# Altium footprint library HSD_connectors.PcbLib: 59 footprints (part 3 of 7) (continued)
## ROS-D4S20L-40MA5-A_V [mm] "HSD Right Angle Plug, Edge Mount Pin in Paste, 27.3x12x6.95mm, Rosenberger Recommended" (continued)
  region: -3.75,1.307 -3.645,1.307 -3.436,1.336 -3.233,1.395 -3.041,1.481 -2.863,1.593 -2.702,1.729 -2.561,1.886 -2.444,2.061 -2.398,2.156 -2.4,2.156 -2.4,5.907 -2.478,5.915 -2.622,5.974 -2.733,6.085 -2.792,6.229 -2.8,6.307 -3.75,6.307 -3.75,3.307 -3.639,3.3 -3.425,3.242 -3.233,3.131 -3.076,2.974 -2.965,2.782 -2.907,2.568 -2.907,2.346 -2.965,2.132 -3.076,1.94 -3.233,1.783 -3.425,1.672 -3.639,1.614 -3.75,1.607
  region: -5.1,6.307 -3.75,6.307 -3.75,3.307 -3.861,3.3 -4.075,3.242 -4.267,3.131 -4.424,2.974 -4.535,2.782 -4.593,2.568 -4.593,2.346 -4.535,2.132 -4.424,1.94 -4.267,1.783 -4.075,1.672 -3.861,1.614 -3.75,1.607 -3.75,1.307 -3.855,1.307 -4.064,1.336 -4.267,1.395 -4.459,1.481 -4.637,1.593 -4.798,1.729 -4.939,1.886 -5.056,2.061 -5.102,2.156 -5.1,2.156
  region: -3.75,11.307 -3.645,11.307 -3.436,11.278 -3.233,11.219 -3.041,11.133 -2.863,11.021 -2.702,10.885 -2.561,10.728 -2.444,10.553 -2.398,10.458 -2.4,10.458 -2.4,6.707 -2.478,6.699 -2.622,6.64 -2.733,6.529 -2.792,6.385 -2.8,6.307 -3.75,6.307 -3.75,9.307 -3.639,9.314 -3.425,9.372 -3.233,9.483 -3.076,9.64 -2.965,9.832 -2.907,10.046 -2.907,10.268 -2.965,10.482 -3.076,10.674 -3.233,10.831 -3.425,10.942 -3.639,11 -3.75,11.007
  region: -5.1,6.307 -3.75,6.307 -3.75,9.307 -3.861,9.314 -4.075,9.372 -4.267,9.483 -4.424,9.64 -4.535,9.832 -4.593,10.046 -4.593,10.268 -4.535,10.482 -4.424,10.674 -4.267,10.831 -4.075,10.942 -3.861,11 -3.75,11.007 -3.75,11.307 -3.855,11.307 -4.064,11.278 -4.267,11.219 -4.459,11.133 -4.637,11.021 -4.798,10.885 -4.939,10.728 -5.056,10.553 -5.102,10.458 -5.1,10.458
  region: 3.75,11.307 3.645,11.307 3.436,11.278 3.233,11.219 3.041,11.133 2.863,11.021 2.702,10.885 2.561,10.728 2.444,10.553 2.398,10.458 2.4,10.458 2.4,6.707 2.478,6.699 2.622,6.64 2.733,6.529 2.792,6.385 2.8,6.307 3.75,6.307 3.75,9.307 3.639,9.314 3.425,9.372 3.233,9.483 3.076,9.64 2.965,9.832 2.907,10.046 2.907,10.268 2.965,10.482 3.076,10.674 3.233,10.831 3.425,10.942 3.639,11 3.75,11.007
  region: 5.1,6.307 3.75,6.307 3.75,9.307 3.861,9.314 4.075,9.372 4.267,9.483 4.424,9.64 4.535,9.832 4.593,10.046 4.593,10.268 4.535,10.482 4.424,10.674 4.267,10.831 4.075,10.942 3.861,11 3.75,11.007 3.75,11.307 3.855,11.307 4.064,11.278 4.267,11.219 4.459,11.133 4.637,11.021 4.798,10.885 4.939,10.728 5.056,10.553 5.102,10.458 5.1,10.458
Top Overlay:
  lines w0.2: -4.5,1.054 -4.5,-0.191 ; -2.903,11.509 2.903,11.509 ; 4.5,1.054 4.5,-0.191 3.725,-0.191 -3.725,-0.191 -4.5,-0.191 ; -4.5,-0.191 -4.5,-0.191
Top Paste:
  drawing of 8 lines, arcs and shapes, not listed
Top Solder:
  drawing of 8 lines, arcs and shapes, not listed
Mechanical 3:
  lines w0.1: -5.7,0 5.8,0
  text "Board Edge" at -5.4,-0.6 h0.2
Mechanical 13:
  circle w0.1: c-1,5.307 r0.34
  circle w0.1: c-1,7.307 r0.34
  circle w0.1: c1,7.307 r0.34
  circle w0.1: c1,5.307 r0.34
  circle w0.1: c3.75,10.157 r0.675
  circle w0.1: c-3.75,10.157 r0.675
  circle w0.1: c-3.75,2.457 r0.675
  circle w0.1: c3.75,2.457 r0.675
  circle w0.1: c0,1.307 r0.7
  lines w0.1: -4.493,0.748 ccw(c-3.75,2.457) -2.42,1.152 ; -4.493,4.166 cw(c-3.75,2.457) -2.42,3.762 -2.42,8.852 cw(c-3.75,10.157) -4.493,8.448 ; -3.725,-2.341 -3.725,-2.241 3.725,-2.241 3.725,-2.341 ; -3.725,-0.491 -0.785,-0.491 ; -3,-2.241 -3,-1.241 ; -2.425,1.151 ccw(c0,1.932) 2.425,1.151 ; -1.7,-7.291 1.7,-7.291 1.7,-6.441 -1.7,-6.441 -1.693,-7.291 ; -1.2,-13.791 1.2,-13.791 ; -0.915,1.194 -1.121,1.194 -1.121,1.42 -0.915,1.42 cw(c0,1.307) -0.798,1.77 ; -0.915,1.194 ccw(c0,1.307) -0.113,0.392 -0.113,0.186 0.113,0.186 0.113,0.392 ccw(c0,1.307) 0.915,1.194 ; -0.798,1.771 -1.025,1.771 -1.025,2.007 -0.6,2.007 ; -0.6,2.007 cw(c0,1.307) -0.261,2.191 ; -0.215,2.357 0.285,2.357 ; 0.25,2.191 0.25,2.357 ; 0.261,2.191 cw(c0,1.307) 0.6,2.007 ; 0.6,2.007 1.025,2.007 1.025,1.771 0.798,1.771 ; 0.785,-0.491 3.725,-0.491 ; 0.798,1.77 cw(c0,1.307) 0.915,1.42 1.121,1.42 1.121,1.194 0.915,1.194 ; 2.42,1.152 ccw(c3.75,2.457) 4.493,0.748 ; 2.898,-2.241 2.898,-1.241 ; 4.493,4.166 ccw(c3.75,2.457) 2.42,3.762 2.42,8.852 ccw(c3.75,10.157) 4.493,8.448 ; 4.747,-4.996 -4.717,-5.011 ; 5.842,-15.791 5.969,-15.791 ; 5.983,-6.518 4.742,-4.99 4.75,-2.341 -4.75,-2.341 -4.717,-5.011 ; -5.983,-6.518 6,-6.518 6,-15.791 -6,-15.791 -5.983,-6.518 ; -5.983,-6.518 -4.717,-5.011 ; -3.725,-0.191 3.725,-0.191 ; -3.725,-0.191 -3.725,-1.241 -3,-1.241 ; -3.725,-0.191 -4.5,-0.191 -4.5,11.509 4.5,11.509 4.5,-0.191 3.725,-0.191 ; -3,-1.241 2.898,-1.241 ; 0.285,2.357 -0.285,2.357 -0.285,2.732 0.285,2.732 0.285,2.357 ; 2.898,-1.241 3.725,-1.241 3.725,-0.191 ; -1.2,-14.655 -1.2,-11.341 1.2,-11.341 1.2,-14.638 -1.2,-14.655 ; -0.875,2.357 cw(c-0.5,2.357) -0.5,2.732 -0.5,2.357 -0.875,2.357 ; -0.25,2.191 -0.25,2.357 -0.25,2.191 ; 0.5,2.357 0.875,2.357 ccw(c0.5,2.357) 0.5,2.732 0.5,2.357
  text ".Designator" at -3.798,-4.402 h2.69
Mechanical 15:
  lines w0.05: -6.1,-15.891 -6.1,11.609 6.1,11.609 6.1,-15.891 -6.1,-15.891
  lines w0.1: -0.5,0 0.5,0 ; 0,-0.5 0,0.5
3D body "d4s20l-40mA5-A.stp": height 10.95, standoff -3.2, extent -6,-15.843 6,11.457

## ROS-D4S20L-40MA5-B_V [mm] "HSD Right Angle Plug, Edge Mount Pin in Paste, 27.3x12x6.95mm, Rosenberger Recommended"
height 6.95
pads (8):
  round 1.4 hole 0.9: 1(-1,7.307) 2(-1,5.307) 3(1,5.307) 4(1,7.307)
  round 2.2 hole 1.7: MH(-3.75,2.457) MH(-3.75,10.157) MH(3.75,2.457) MH(3.75,10.157)
Top Layer:
  region: 1.75,9.007 1.75,9.081 1.721,9.226 1.665,9.362 1.583,9.485 1.478,9.59 1.355,9.672 1.219,9.728 1.074,9.757 1,9.757 1,7.757 1.088,7.748 1.25,7.681 1.374,7.557 1.441,7.395 1.441,7.219 1.374,7.057 1.25,6.933 1.088,6.866 1,6.857 1,6.557 1.074,6.557 1.219,6.586 1.355,6.642 1.478,6.724 1.583,6.829 1.665,6.952 1.721,7.088 1.75,7.233 1.75,7.307
  region: 0.25,9.007 0.25,9.081 0.279,9.226 0.335,9.362 0.417,9.485 0.522,9.59 0.645,9.672 0.781,9.728 0.926,9.757 1,9.757 1,7.757 0.912,7.748 0.75,7.681 0.626,7.557 0.559,7.395 0.559,7.219 0.626,7.057 0.75,6.933 0.912,6.866 1,6.857 1,6.557 0.926,6.557 0.781,6.586 0.645,6.642 0.522,6.724 0.417,6.829 0.335,6.952 0.279,7.088 0.25,7.233 0.25,7.307
  region: 0.25,3.607 0.25,3.533 0.279,3.388 0.335,3.252 0.417,3.129 0.522,3.024 0.645,2.942 0.781,2.886 0.926,2.857 1,2.857 1,4.857 0.912,4.866 0.75,4.933 0.626,5.057 0.559,5.219 0.559,5.395 0.626,5.557 0.75,5.681 0.912,5.748 1,5.757 1,6.057 0.926,6.057 0.781,6.028 0.645,5.972 0.522,5.89 0.417,5.785 0.335,5.662 0.279,5.526 0.25,5.381 0.25,5.307
  region: 1.75,3.607 1.75,3.533 1.721,3.388 1.665,3.252 1.583,3.129 1.478,3.024 1.355,2.942 1.219,2.886 1.074,2.857 1,2.857 1,4.857 1.088,4.866 1.25,4.933 1.374,5.057 1.441,5.219 1.441,5.395 1.374,5.557 1.25,5.681 1.088,5.748 1,5.757 1,6.057 1.074,6.057 1.219,6.028 1.355,5.972 1.478,5.89 1.583,5.785 1.665,5.662 1.721,5.526 1.75,5.381 1.75,5.307
  region: -0.25,3.607 -0.25,3.533 -0.279,3.388 -0.335,3.252 -0.417,3.129 -0.522,3.024 -0.645,2.942 -0.781,2.886 -0.926,2.857 -1,2.857 -1,4.857 -0.912,4.866 -0.75,4.933 -0.626,5.057 -0.559,5.219 -0.559,5.395 -0.626,5.557 -0.75,5.681 -0.912,5.748 -1,5.757 -1,6.057 -0.926,6.057 -0.781,6.028 -0.645,5.972 -0.522,5.89 -0.417,5.785 -0.335,5.662 -0.279,5.526 -0.25,5.381 -0.25,5.307
  region: -1.75,3.607 -1.75,3.533 -1.721,3.388 -1.665,3.252 -1.583,3.129 -1.478,3.024 -1.355,2.942 -1.219,2.886 -1.074,2.857 -1,2.857 -1,4.857 -1.088,4.866 -1.25,4.933 -1.374,5.057 -1.441,5.219 -1.441,5.395 -1.374,5.557 -1.25,5.681 -1.088,5.748 -1,5.757 -1,6.057 -1.074,6.057 -1.219,6.028 -1.355,5.972 -1.478,5.89 -1.583,5.785 -1.665,5.662 -1.721,5.526 -1.75,5.381 -1.75,5.307
  region: -0.25,9.007 -0.25,9.081 -0.279,9.226 -0.335,9.362 -0.417,9.485 -0.522,9.59 -0.645,9.672 -0.781,9.728 -0.926,9.757 -1,9.757 -1,7.757 -0.912,7.748 -0.75,7.681 -0.626,7.557 -0.559,7.395 -0.559,7.219 -0.626,7.057 -0.75,6.933 -0.912,6.866 -1,6.857 -1,6.557 -0.926,6.557 -0.781,6.586 -0.645,6.642 -0.522,6.724 -0.417,6.829 -0.335,6.952 -0.279,7.088 -0.25,7.233 -0.25,7.307
  region: -1.75,9.007 -1.75,9.081 -1.721,9.226 -1.665,9.362 -1.583,9.485 -1.478,9.59 -1.355,9.672 -1.219,9.728 -1.074,9.757 -1,9.757 -1,7.757 -1.088,7.748 -1.25,7.681 -1.374,7.557 -1.441,7.395 -1.441,7.219 -1.374,7.057 -1.25,6.933 -1.088,6.866 -1,6.857 -1,6.557 -1.074,6.557 -1.219,6.586 -1.355,6.642 -1.478,6.724 -1.583,6.829 -1.665,6.952 -1.721,7.088 -1.75,7.233 -1.75,7.307
  region: 5.1,6.307 3.75,6.307 3.75,3.307 3.861,3.3 4.075,3.242 4.267,3.131 4.424,2.974 4.535,2.782 4.593,2.568 4.593,2.346 4.535,2.132 4.424,1.94 4.267,1.783 4.075,1.672 3.861,1.614 3.75,1.607 3.75,1.307 3.855,1.307 4.064,1.336 4.267,1.395 4.459,1.481 4.637,1.593 4.798,1.729 4.939,1.886 5.056,2.061 5.102,2.156 5.1,2.156
  region: 3.75,1.307 3.645,1.307 3.436,1.336 3.233,1.395 3.041,1.481 2.863,1.593 2.702,1.729 2.561,1.886 2.444,2.061 2.398,2.156 2.4,2.156 2.4,5.907 2.478,5.915 2.622,5.974 2.733,6.085 2.792,6.229 2.8,6.307 3.75,6.307 3.75,3.307 3.639,3.3 3.425,3.242 3.233,3.131 3.076,2.974 2.965,2.782 2.907,2.568 2.907,2.346 2.965,2.132 3.076,1.94 3.233,1.783 3.425,1.672 3.639,1.614 3.75,1.607
  region: -3.75,1.307 -3.645,1.307 -3.436,1.336 -3.233,1.395 -3.041,1.481 -2.863,1.593 -2.702,1.729 -2.561,1.886 -2.444,2.061 -2.398,2.156 -2.4,2.156 -2.4,5.907 -2.478,5.915 -2.622,5.974 -2.733,6.085 -2.792,6.229 -2.8,6.307 -3.75,6.307 -3.75,3.307 -3.639,3.3 -3.425,3.242 -3.233,3.131 -3.076,2.974 -2.965,2.782 -2.907,2.568 -2.907,2.346 -2.965,2.132 -3.076,1.94 -3.233,1.783 -3.425,1.672 -3.639,1.614 -3.75,1.607
  region: -5.1,6.307 -3.75,6.307 -3.75,3.307 -3.861,3.3 -4.075,3.242 -4.267,3.131 -4.424,2.974 -4.535,2.782 -4.593,2.568 -4.593,2.346 -4.535,2.132 -4.424,1.94 -4.267,1.783 -4.075,1.672 -3.861,1.614 -3.75,1.607 -3.75,1.307 -3.855,1.307 -4.064,1.336 -4.267,1.395 -4.459,1.481 -4.637,1.593 -4.798,1.729 -4.939,1.886 -5.056,2.061 -5.102,2.156 -5.1,2.156
  region: -3.75,11.307 -3.645,11.307 -3.436,11.278 -3.233,11.219 -3.041,11.133 -2.863,11.021 -2.702,10.885 -2.561,10.728 -2.444,10.553 -2.398,10.458 -2.4,10.458 -2.4,6.707 -2.478,6.699 -2.622,6.64 -2.733,6.529 -2.792,6.385 -2.8,6.307 -3.75,6.307 -3.75,9.307 -3.639,9.314 -3.425,9.372 -3.233,9.483 -3.076,9.64 -2.965,9.832 -2.907,10.046 -2.907,10.268 -2.965,10.482 -3.076,10.674 -3.233,10.831 -3.425,10.942 -3.639,11 -3.75,11.007
  region: -5.1,6.307 -3.75,6.307 -3.75,9.307 -3.861,9.314 -4.075,9.372 -4.267,9.483 -4.424,9.64 -4.535,9.832 -4.593,10.046 -4.593,10.268 -4.535,10.482 -4.424,10.674 -4.267,10.831 -4.075,10.942 -3.861,11 -3.75,11.007 -3.75,11.307 -3.855,11.307 -4.064,11.278 -4.267,11.219 -4.459,11.133 -4.637,11.021 -4.798,10.885 -4.939,10.728 -5.056,10.553 -5.102,10.458 -5.1,10.458
  region: 3.75,11.307 3.645,11.307 3.436,11.278 3.233,11.219 3.041,11.133 2.863,11.021 2.702,10.885 2.561,10.728 2.444,10.553 2.398,10.458 2.4,10.458 2.4,6.707 2.478,6.699 2.622,6.64 2.733,6.529 2.792,6.385 2.8,6.307 3.75,6.307 3.75,9.307 3.639,9.314 3.425,9.372 3.233,9.483 3.076,9.64 2.965,9.832 2.907,10.046 2.907,10.268 2.965,10.482 3.076,10.674 3.233,10.831 3.425,10.942 3.639,11 3.75,11.007
  region: 5.1,6.307 3.75,6.307 3.75,9.307 3.861,9.314 4.075,9.372 4.267,9.483 4.424,9.64 4.535,9.832 4.593,10.046 4.593,10.268 4.535,10.482 4.424,10.674 4.267,10.831 4.075,10.942 3.861,11 3.75,11.007 3.75,11.307 3.855,11.307 4.064,11.278 4.267,11.219 4.459,11.133 4.637,11.021 4.798,10.885 4.939,10.728 5.056,10.553 5.102,10.458 5.1,10.458
Top Overlay:
  lines w0.2: -4.5,1.054 -4.5,-0.191 ; -2.903,11.509 2.903,11.509 ; 4.5,1.054 4.5,-0.191 3.725,-0.191 -3.725,-0.191 -4.5,-0.191 ; -4.5,-0.191 -4.5,-0.191
Top Paste:
  drawing of 8 lines, arcs and shapes, not listed
Top Solder:
  drawing of 8 lines, arcs and shapes, not listed
Mechanical 3:
  lines w0.1: -5.6,0 5.6,0
  text "Board Edge" at -5.6,-0.6 h0.2
Mechanical 13:
  circle w0.1: c0,1.307 r0.7
  circle w0.1: c-1,5.307 r0.34
  circle w0.1: c-1,7.307 r0.34
  circle w0.1: c1,7.307 r0.34
  circle w0.1: c1,5.307 r0.34
  circle w0.1: c3.75,10.157 r0.675
  circle w0.1: c-3.75,10.157 r0.675
  circle w0.1: c-3.75,2.457 r0.675
  circle w0.1: c3.75,2.457 r0.675
  lines w0.1: -4.493,0.748 ccw(c-3.75,2.457) -2.42,1.152 ; -4.493,4.166 cw(c-3.75,2.457) -2.42,3.762 -2.42,8.852 cw(c-3.75,10.157) -4.493,8.448 ; -3.725,-2.341 -3.725,-2.241 3.725,-2.241 3.725,-2.341 ; -3.725,-0.491 -0.785,-0.491 ; -3,-2.241 -3,-1.241 ; -2.425,1.151 ccw(c0,1.932) 2.425,1.151 ; -1.7,-7.291 1.7,-7.291 1.7,-6.441 -1.7,-6.441 -1.693,-7.291 ; -1.2,-13.791 1.2,-13.791 ; -0.915,1.194 -1.121,1.194 -1.121,1.42 -0.915,1.42 cw(c0,1.307) -0.251,2.194 ; -0.915,1.194 ccw(c0,1.307) -0.798,0.844 ; -0.798,0.843 -1.025,0.843 -1.025,0.607 -0.6,0.607 ; -0.6,0.607 ccw(c0,1.307) -0.113,0.392 -0.113,0.186 0.113,0.186 0.113,0.392 ccw(c0,1.307) 0.915,1.194 ; -0.215,2.357 0.285,2.357 ; 0.25,2.191 0.25,2.357 -0.25,2.357 ; 0.261,2.191 cw(c0,1.307) 0.6,2.007 ; 0.6,2.007 1.025,2.007 1.025,1.771 0.798,1.771 ; 0.785,-0.491 3.725,-0.491 ; 0.798,1.77 cw(c0,1.307) 0.915,1.42 1.121,1.42 1.121,1.194 0.915,1.194 ; 2.42,1.152 ccw(c3.75,2.457) 4.493,0.748 ; 2.898,-2.241 2.898,-1.241 ; 4.493,4.166 ccw(c3.75,2.457) 2.42,3.762 2.42,8.852 ccw(c3.75,10.157) 4.493,8.448 ; 4.747,-4.996 -4.717,-5.011 ; 5.842,-15.791 5.969,-15.791 ; 5.983,-6.518 4.742,-4.99 4.75,-2.341 -4.75,-2.341 -4.717,-5.011 ; -5.983,-6.518 6,-6.518 6,-15.791 -6,-15.791 -5.983,-6.518 ; -5.983,-6.518 -4.717,-5.011 ; -3.725,-0.191 3.725,-0.191 ; -3.725,-0.191 -3.725,-1.241 -3,-1.241 ; -3.725,-0.191 -4.5,-0.191 -4.5,11.509 4.5,11.509 4.5,-0.191 3.725,-0.191 ; -3,-1.241 2.898,-1.241 ; -0.25,2.357 -0.25,2.191 -0.25,2.357 ; 0.285,2.357 -0.285,2.357 -0.285,2.732 0.285,2.732 0.285,2.357 ; 2.898,-1.241 3.725,-1.241 3.725,-0.191 ; -1.2,-14.655 -1.2,-11.341 1.2,-11.341 1.2,-14.638 -1.2,-14.655 ; -0.875,2.357 cw(c-0.5,2.357) -0.5,2.732 -0.5,2.357 -0.875,2.357 ; 0.5,2.357 0.875,2.357 ccw(c0.5,2.357) 0.5,2.732 0.5,2.357
  text ".Designator" at -3.671,-4.402 h2.69
Mechanical 15:
  lines w0.05: -6.1,-15.891 -6.1,11.609 6.1,11.609 6.1,-15.891 -6.1,-15.891
  lines w0.1: -0.5,0 0.5,0 ; 0,-0.5 0,0.5
3D body "d4s20l-40mA5-B.stp": height 10.95, standoff -3.2, extent -6,-15.791 6,11.509

## ROS-D4S20L-40MA5-C_V [mm] "HSD Right Angle Plug, Edge Mount Pin in Paste, 27.3x12x6.95mm, Rosenberger Recommended"
height 6.95
pads (8):
  round 1.4 hole 0.9: 1(-1,7.307) 2(-1,5.307) 3(1,5.307) 4(1,7.307)
  round 2.2 hole 1.7: MH(-3.75,2.457) MH(-3.75,10.157) MH(3.75,2.457) MH(3.75,10.157)
Top Layer:
  region: 5.1,6.307 3.75,6.307 3.75,3.307 3.861,3.3 4.075,3.242 4.267,3.131 4.424,2.974 4.535,2.782 4.593,2.568 4.593,2.346 4.535,2.132 4.424,1.94 4.267,1.783 4.075,1.672 3.861,1.614 3.75,1.607 3.75,1.307 3.855,1.307 4.064,1.336 4.267,1.395 4.459,1.481 4.637,1.593 4.798,1.729 4.939,1.886 5.056,2.061 5.102,2.156 5.1,2.156
  region: 3.75,1.307 3.645,1.307 3.436,1.336 3.233,1.395 3.041,1.481 2.863,1.593 2.702,1.729 2.561,1.886 2.444,2.061 2.398,2.156 2.4,2.156 2.4,5.907 2.478,5.915 2.622,5.974 2.733,6.085 2.792,6.229 2.8,6.307 3.75,6.307 3.75,3.307 3.639,3.3 3.425,3.242 3.233,3.131 3.076,2.974 2.965,2.782 2.907,2.568 2.907,2.346 2.965,2.132 3.076,1.94 3.233,1.783 3.425,1.672 3.639,1.614 3.75,1.607
  region: -3.75,1.307 -3.645,1.307 -3.436,1.336 -3.233,1.395 -3.041,1.481 -2.863,1.593 -2.702,1.729 -2.561,1.886 -2.444,2.061 -2.398,2.156 -2.4,2.156 -2.4,5.907 -2.478,5.915 -2.622,5.974 -2.733,6.085 -2.792,6.229 -2.8,6.307 -3.75,6.307 -3.75,3.307 -3.639,3.3 -3.425,3.242 -3.233,3.131 -3.076,2.974 -2.965,2.782 -2.907,2.568 -2.907,2.346 -2.965,2.132 -3.076,1.94 -3.233,1.783 -3.425,1.672 -3.639,1.614 -3.75,1.607
  region: -5.1,6.307 -3.75,6.307 -3.75,3.307 -3.861,3.3 -4.075,3.242 -4.267,3.131 -4.424,2.974 -4.535,2.782 -4.593,2.568 -4.593,2.346 -4.535,2.132 -4.424,1.94 -4.267,1.783 -4.075,1.672 -3.861,1.614 -3.75,1.607 -3.75,1.307 -3.855,1.307 -4.064,1.336 -4.267,1.395 -4.459,1.481 -4.637,1.593 -4.798,1.729 -4.939,1.886 -5.056,2.061 -5.102,2.156 -5.1,2.156
  region: -3.75,11.307 -3.645,11.307 -3.436,11.278 -3.233,11.219 -3.041,11.133 -2.863,11.021 -2.702,10.885 -2.561,10.728 -2.444,10.553 -2.398,10.458 -2.4,10.458 -2.4,6.707 -2.478,6.699 -2.622,6.64 -2.733,6.529 -2.792,6.385 -2.8,6.307 -3.75,6.307 -3.75,9.307 -3.639,9.314 -3.425,9.372 -3.233,9.483 -3.076,9.64 -2.965,9.832 -2.907,10.046 -2.907,10.268 -2.965,10.482 -3.076,10.674 -3.233,10.831 -3.425,10.942 -3.639,11 -3.75,11.007
  region: -5.1,6.307 -3.75,6.307 -3.75,9.307 -3.861,9.314 -4.075,9.372 -4.267,9.483 -4.424,9.64 -4.535,9.832 -4.593,10.046 -4.593,10.268 -4.535,10.482 -4.424,10.674 -4.267,10.831 -4.075,10.942 -3.861,11 -3.75,11.007 -3.75,11.307 -3.855,11.307 -4.064,11.278 -4.267,11.219 -4.459,11.133 -4.637,11.021 -4.798,10.885 -4.939,10.728 -5.056,10.553 -5.102,10.458 -5.1,10.458
  region: 3.75,11.307 3.645,11.307 3.436,11.278 3.233,11.219 3.041,11.133 2.863,11.021 2.702,10.885 2.561,10.728 2.444,10.553 2.398,10.458 2.4,10.458 2.4,6.707 2.478,6.699 2.622,6.64 2.733,6.529 2.792,6.385 2.8,6.307 3.75,6.307 3.75,9.307 3.639,9.314 3.425,9.372 3.233,9.483 3.076,9.64 2.965,9.832 2.907,10.046 2.907,10.268 2.965,10.482 3.076,10.674 3.233,10.831 3.425,10.942 3.639,11 3.75,11.007
  region: 5.1,6.307 3.75,6.307 3.75,9.307 3.861,9.314 4.075,9.372 4.267,9.483 4.424,9.64 4.535,9.832 4.593,10.046 4.593,10.268 4.535,10.482 4.424,10.674 4.267,10.831 4.075,10.942 3.861,11 3.75,11.007 3.75,11.307 3.855,11.307 4.064,11.278 4.267,11.219 4.459,11.133 4.637,11.021 4.798,10.885 4.939,10.728 5.056,10.553 5.102,10.458 5.1,10.458
  region: 1.75,9.007 1.75,9.081 1.721,9.226 1.665,9.362 1.583,9.485 1.478,9.59 1.355,9.672 1.219,9.728 1.074,9.757 1,9.757 1,7.757 1.088,7.748 1.25,7.681 1.374,7.557 1.441,7.395 1.441,7.219 1.374,7.057 1.25,6.933 1.088,6.866 1,6.857 1,6.557 1.074,6.557 1.219,6.586 1.355,6.642 1.478,6.724 1.583,6.829 1.665,6.952 1.721,7.088 1.75,7.233 1.75,7.307
  region: 0.25,9.007 0.25,9.081 0.279,9.226 0.335,9.362 0.417,9.485 0.522,9.59 0.645,9.672 0.781,9.728 0.926,9.757 1,9.757 1,7.757 0.912,7.748 0.75,7.681 0.626,7.557 0.559,7.395 0.559,7.219 0.626,7.057 0.75,6.933 0.912,6.866 1,6.857 1,6.557 0.926,6.557 0.781,6.586 0.645,6.642 0.522,6.724 0.417,6.829 0.335,6.952 0.279,7.088 0.25,7.233 0.25,7.307
  region: 0.25,3.607 0.25,3.533 0.279,3.388 0.335,3.252 0.417,3.129 0.522,3.024 0.645,2.942 0.781,2.886 0.926,2.857 1,2.857 1,4.857 0.912,4.866 0.75,4.933 0.626,5.057 0.559,5.219 0.559,5.395 0.626,5.557 0.75,5.681 0.912,5.748 1,5.757 1,6.057 0.926,6.057 0.781,6.028 0.645,5.972 0.522,5.89 0.417,5.785 0.335,5.662 0.279,5.526 0.25,5.381 0.25,5.307
  region: 1.75,3.607 1.75,3.533 1.721,3.388 1.665,3.252 1.583,3.129 1.478,3.024 1.355,2.942 1.219,2.886 1.074,2.857 1,2.857 1,4.857 1.088,4.866 1.25,4.933 1.374,5.057 1.441,5.219 1.441,5.395 1.374,5.557 1.25,5.681 1.088,5.748 1,5.757 1,6.057 1.074,6.057 1.219,6.028 1.355,5.972 1.478,5.89 1.583,5.785 1.665,5.662 1.721,5.526 1.75,5.381 1.75,5.307
  region: -0.25,3.607 -0.25,3.533 -0.279,3.388 -0.335,3.252 -0.417,3.129 -0.522,3.024 -0.645,2.942 -0.781,2.886 -0.926,2.857 -1,2.857 -1,4.857 -0.912,4.866 -0.75,4.933 -0.626,5.057 -0.559,5.219 -0.559,5.395 -0.626,5.557 -0.75,5.681 -0.912,5.748 -1,5.757 -1,6.057 -0.926,6.057 -0.781,6.028 -0.645,5.972 -0.522,5.89 -0.417,5.785 -0.335,5.662 -0.279,5.526 -0.25,5.381 -0.25,5.307
  region: -1.75,3.607 -1.75,3.533 -1.721,3.388 -1.665,3.252 -1.583,3.129 -1.478,3.024 -1.355,2.942 -1.219,2.886 -1.074,2.857 -1,2.857 -1,4.857 -1.088,4.866 -1.25,4.933 -1.374,5.057 -1.441,5.219 -1.441,5.395 -1.374,5.557 -1.25,5.681 -1.088,5.748 -1,5.757 -1,6.057 -1.074,6.057 -1.219,6.028 -1.355,5.972 -1.478,5.89 -1.583,5.785 -1.665,5.662 -1.721,5.526 -1.75,5.381 -1.75,5.307
  region: -0.25,9.007 -0.25,9.081 -0.279,9.226 -0.335,9.362 -0.417,9.485 -0.522,9.59 -0.645,9.672 -0.781,9.728 -0.926,9.757 -1,9.757 -1,7.757 -0.912,7.748 -0.75,7.681 -0.626,7.557 -0.559,7.395 -0.559,7.219 -0.626,7.057 -0.75,6.933 -0.912,6.866 -1,6.857 -1,6.557 -0.926,6.557 -0.781,6.586 -0.645,6.642 -0.522,6.724 -0.417,6.829 -0.335,6.952 -0.279,7.088 -0.25,7.233 -0.25,7.307
  region: -1.75,9.007 -1.75,9.081 -1.721,9.226 -1.665,9.362 -1.583,9.485 -1.478,9.59 -1.355,9.672 -1.219,9.728 -1.074,9.757 -1,9.757 -1,7.757 -1.088,7.748 -1.25,7.681 -1.374,7.557 -1.441,7.395 -1.441,7.219 -1.374,7.057 -1.25,6.933 -1.088,6.866 -1,6.857 -1,6.557 -1.074,6.557 -1.219,6.586 -1.355,6.642 -1.478,6.724 -1.583,6.829 -1.665,6.952 -1.721,7.088 -1.75,7.233 -1.75,7.307
Top Overlay:
  lines w0.2: -4.5,1.054 -4.5,-0.191 ; -2.903,11.509 2.903,11.509 ; 4.5,1.054 4.5,-0.191 3.725,-0.191 -3.725,-0.191 -4.5,-0.191 ; -4.5,-0.191 -4.5,-0.191
Top Paste:
  drawing of 10 lines, arcs and shapes, not listed
Top Solder:
  drawing of 8 lines, arcs and shapes, not listed
Mechanical 3:
  lines w0.1: -5.8,0 5.8,0
  text "Board Edge" at -5.8,0.2 h0.2
Mechanical 13:
  circle w0.1: c0,1.282 r0.7
  circle w0.1: c-1,5.307 r0.34
  circle w0.1: c-1,7.307 r0.34
  circle w0.1: c1,7.307 r0.34
  circle w0.1: c1,5.307 r0.34
  circle w0.1: c3.75,10.157 r0.675
  circle w0.1: c-3.75,10.157 r0.675
  circle w0.1: c-3.75,2.457 r0.675
  circle w0.1: c3.75,2.457 r0.675
  lines w0.1: -4.493,0.748 ccw(c-3.75,2.457) -2.42,1.152 ; -4.493,4.166 cw(c-3.75,2.457) -2.42,3.762 -2.42,8.852 cw(c-3.75,10.157) -4.493,8.448 ; -3.725,-2.341 -3.725,-2.241 3.725,-2.241 3.725,-2.341 ; -3.725,-0.491 -0.785,-0.491 ; -3,-2.241 -3,-1.241 ; -2.425,1.151 ccw(c0,1.932) 2.425,1.151 ; -1.7,-7.291 1.7,-7.291 1.7,-6.441 -1.7,-6.441 -1.693,-7.291 ; -1.2,-13.791 1.2,-13.791 ; -0.915,1.169 -1.121,1.169 -1.121,1.395 -0.915,1.395 cw(c0,1.282) -0.798,1.745 ; -0.915,1.169 ccw(c0,1.282) -0.113,0.367 -0.113,0.161 0.113,0.161 0.113,0.367 ccw(c0,1.282) 0.6,0.582 ; -0.798,1.746 -1.025,1.746 -1.025,1.982 -0.6,1.982 ; -0.6,1.982 cw(c0,1.282) -0.261,2.166 ; -0.215,2.332 0.285,2.332 ; 0.25,2.166 0.25,2.332 -0.25,2.332 ; 0.251,2.169 cw(c0,1.282) 0.915,1.395 1.121,1.395 1.121,1.169 0.915,1.169 ; 0.6,0.582 1.025,0.582 1.025,0.818 0.798,0.818 ; 0.785,-0.491 3.725,-0.491 ; 0.798,0.819 ccw(c0,1.282) 0.915,1.169 ; 2.42,1.152 ccw(c3.75,2.457) 4.493,0.748 ; 2.898,-2.241 2.898,-1.241 ; 4.493,4.166 ccw(c3.75,2.457) 2.42,3.762 2.42,8.852 ccw(c3.75,10.157) 4.493,8.448 ; 4.747,-4.996 -4.717,-5.011 ; 5.842,-15.791 5.969,-15.791 ; 5.983,-6.518 4.742,-4.99 4.75,-2.341 -4.75,-2.341 -4.717,-5.011 ; -5.983,-6.518 6,-6.518 6,-15.791 -6,-15.791 -5.983,-6.518 ; -5.983,-6.518 -4.717,-5.011 ; -3.725,-0.191 3.725,-0.191 ; -3.725,-0.191 -3.725,-1.241 -3,-1.241 ; -3.725,-0.191 -4.5,-0.191 -4.5,11.509 4.5,11.509 4.5,-0.191 3.725,-0.191 ; -3,-1.241 2.898,-1.241 ; -0.25,2.332 -0.25,2.166 -0.25,2.332 ; 0.285,2.332 -0.285,2.332 -0.285,2.707 0.285,2.707 0.285,2.332 ; 2.898,-1.241 3.725,-1.241 3.725,-0.191 ; -1.2,-14.655 -1.2,-11.341 1.2,-11.341 1.2,-14.638 -1.2,-14.655 ; -0.875,2.332 cw(c-0.5,2.332) -0.5,2.707 -0.5,2.332 -0.875,2.332 ; 0.5,2.332 0.875,2.332 ccw(c0.5,2.332) 0.5,2.707 0.5,2.332
  text ".Designator" at -3.417,-4.529 h2.69
Mechanical 15:
  lines w0.05: -6.1,-15.891 -6.1,11.609 6.1,11.609 6.1,-15.891 -6.1,-15.891
  lines w0.1: -0.5,0 0.5,0 ; 0,-0.5 0,0.5
3D body "d4s20l-40mA5-C.stp": height 10.95, standoff -3.2, extent -6,-15.791 6,11.509